# Altium schematic symbol library jlcpcb_2025_04_capacitors_extended_0402.schlib: 3594 symbols (part 18 of 20)
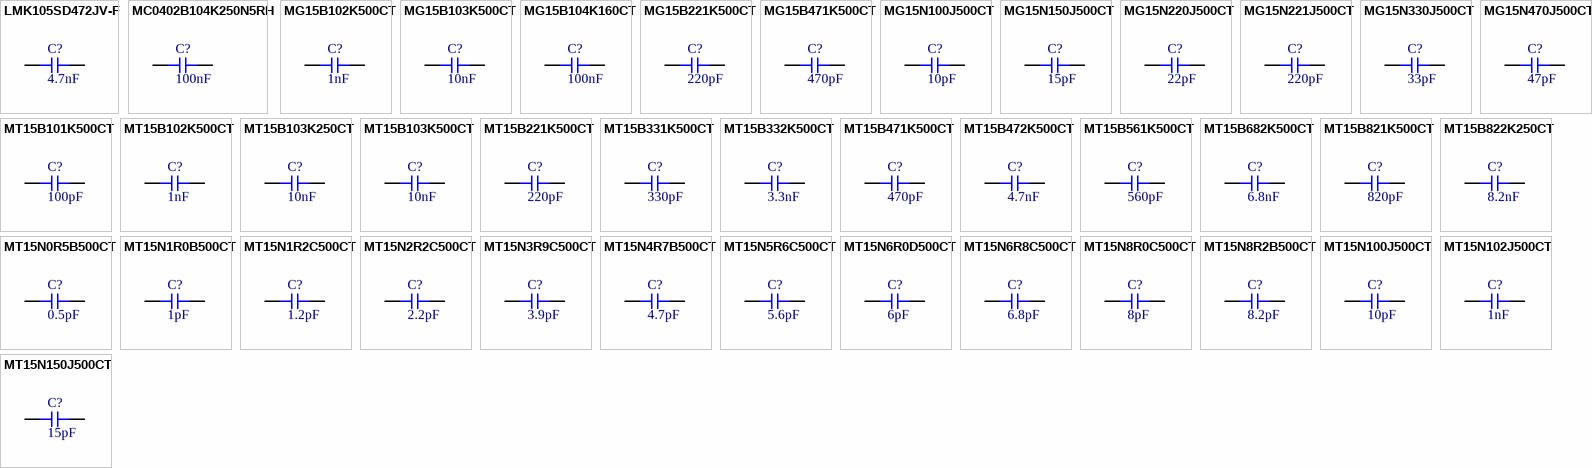
[diagram p106: symbols LMK105SD472JV-F to MT15N150J500CT]

## MT15B822K250CT
designator C?  Capacitance: 8.2nF  (hidden comment: *)
Capacitor, Ceramic (MLCC), 8.2nF, ±10%, 25V, X7R, ±10%, SMD 0402; Manufacturer: Walsin Tech Corp; Manufacturer Part Number: MT15B822K250CT; Package Size: 0402; JLCPCB Basic Part: No; JLCPCB Part Number: C323590; Supplier 1: LCSC; Category: Capacitors - MLCC; Supplier Part Number 1: C323590; Tolerance: ±10%; Voltage Rating: 25V; Temperature Coefficient: X7R; RoHS: Yes; ComponentLink1Description: Datasheet; ComponentLink1URL: https://wmsc.lcsc.com/wmsc/upload/file/pdf/v2/lcsc/2304140030_Walsin-Tech-Corp-MT15B822K250CT_C323590.pdf; ComponentLink2Description: JLCPCB Part URL; ComponentLink2URL: https://jlcpcb.com/partdetail/C323590; ComponentLink3Description: LCSC Part URL; ComponentLink3URL: https://lcsc.com/product-detail/Multilayer-Ceramic-Capacitors-MLCC---SMD-SMT_Walsin-Tech-Corp-Walsin-Tech-Corp-MT15B822K250CT_C323590.html
footprint CAP-0402 (0402 (1005M) Capacitor)
pins: 1, 2

## MT15N0R5B500CT
designator C?  Capacitance: 0.5pF  (hidden comment: *)
Capacitor, Ceramic (MLCC), 0.5pF, 50V, NP0, SMD 0402; Manufacturer: Walsin Tech Corp; Manufacturer Part Number: MT15N0R5B500CT; Package Size: 0402; JLCPCB Basic Part: No; JLCPCB Part Number: C5139576; Supplier 1: LCSC; Category: Capacitors - MLCC; Supplier Part Number 1: C5139576; Voltage Rating: 50V; Temperature Coefficient: NP0; RoHS: Yes; ComponentLink1Description: Datasheet; ComponentLink1URL: https://wmsc.lcsc.com/wmsc/upload/file/pdf/v2/lcsc/2208260930_Walsin-Tech-Corp-MT15N0R5B500CT_C5139576.pdf; ComponentLink2Description: JLCPCB Part URL; ComponentLink2URL: https://jlcpcb.com/partdetail/C5139576; ComponentLink3Description: LCSC Part URL; ComponentLink3URL: https://lcsc.com/product-detail/Multilayer-Ceramic-Capacitors-MLCC---SMD-SMT_Walsin-Tech-Corp-Walsin-Tech-Corp-MT15N0R5B500CT_C5139576.html
footprint CAP-0402 (0402 (1005M) Capacitor)
pins: 1, 2

## MT15N1R0B500CT
designator C?  Capacitance: 1pF  (hidden comment: *)
Capacitor, Ceramic (MLCC), 1pF, 50V, NP0, SMD 0402; Manufacturer: Walsin Tech Corp; Manufacturer Part Number: MT15N1R0B500CT; Package Size: 0402; JLCPCB Basic Part: No; JLCPCB Part Number: C323585; Supplier 1: LCSC; Category: Capacitors - MLCC; Supplier Part Number 1: C323585; Voltage Rating: 50V; Temperature Coefficient: NP0; RoHS: Yes; ComponentLink1Description: Datasheet; ComponentLink1URL: https://wmsc.lcsc.com/wmsc/upload/file/pdf/v2/lcsc/2304140030_Walsin-Tech-Corp-MT15N1R0B500CT_C323585.pdf; ComponentLink2Description: JLCPCB Part URL; ComponentLink2URL: https://jlcpcb.com/partdetail/C323585; ComponentLink3Description: LCSC Part URL; ComponentLink3URL: https://lcsc.com/product-detail/Multilayer-Ceramic-Capacitors-MLCC---SMD-SMT_Walsin-Tech-Corp-Walsin-Tech-Corp-MT15N1R0B500CT_C323585.html
footprint CAP-0402 (0402 (1005M) Capacitor)
pins: 1, 2

## MT15N1R2C500CT
designator C?  Capacitance: 1.2pF  (hidden comment: *)
Capacitor, Ceramic (MLCC), 1.2pF, 50V, NP0, SMD 0402; Manufacturer: Walsin Tech Corp; Manufacturer Part Number: MT15N1R2C500CT; Package Size: 0402; JLCPCB Basic Part: No; JLCPCB Part Number: C908524; Supplier 1: LCSC; Category: Capacitors - MLCC; Supplier Part Number 1: C908524; Voltage Rating: 50V; Temperature Coefficient: NP0; RoHS: Yes; ComponentLink1Description: Datasheet; ComponentLink1URL: https://wmsc.lcsc.com/wmsc/upload/file/pdf/v2/lcsc/2304140030_Walsin-Tech-Corp-MT15N1R2C500CT_C908524.pdf; ComponentLink2Description: JLCPCB Part URL; ComponentLink2URL: https://jlcpcb.com/partdetail/C908524; ComponentLink3Description: LCSC Part URL; ComponentLink3URL: https://lcsc.com/product-detail/Multilayer-Ceramic-Capacitors-MLCC---SMD-SMT_Walsin-Tech-Corp-Walsin-Tech-Corp-MT15N1R2C500CT_C908524.html
footprint CAP-0402 (0402 (1005M) Capacitor)
pins: 1, 2

## MT15N2R2C500CT
designator C?  Capacitance: 2.2pF  (hidden comment: *)
Capacitor, Ceramic (MLCC), 2.2pF, 50V, NP0, SMD 0402; Manufacturer: Walsin Tech Corp; Manufacturer Part Number: MT15N2R2C500CT; Package Size: 0402; JLCPCB Basic Part: No; JLCPCB Part Number: C335537; Supplier 1: LCSC; Category: Capacitors - MLCC; Supplier Part Number 1: C335537; Voltage Rating: 50V; Temperature Coefficient: NP0; RoHS: Yes; ComponentLink1Description: Datasheet; ComponentLink1URL: https://wmsc.lcsc.com/wmsc/upload/file/pdf/v2/lcsc/2304140030_Walsin-Tech-Corp-MT15N2R2C500CT_C335537.pdf; ComponentLink2Description: JLCPCB Part URL; ComponentLink2URL: https://jlcpcb.com/partdetail/C335537; ComponentLink3Description: LCSC Part URL; ComponentLink3URL: https://lcsc.com/product-detail/Multilayer-Ceramic-Capacitors-MLCC---SMD-SMT_Walsin-Tech-Corp-Walsin-Tech-Corp-MT15N2R2C500CT_C335537.html
footprint CAP-0402 (0402 (1005M) Capacitor)
pins: 1, 2

## MT15N3R9C500CT
designator C?  Capacitance: 3.9pF  (hidden comment: *)
Capacitor, Ceramic (MLCC), 3.9pF, 50V, NP0, SMD 0402; Manufacturer: Walsin Tech Corp; Manufacturer Part Number: MT15N3R9C500CT; Package Size: 0402; JLCPCB Basic Part: No; JLCPCB Part Number: C323581; Supplier 1: LCSC; Category: Capacitors - MLCC; Supplier Part Number 1: C323581; Voltage Rating: 50V; Temperature Coefficient: NP0; RoHS: Yes; ComponentLink1Description: Datasheet; ComponentLink1URL: https://wmsc.lcsc.com/wmsc/upload/file/pdf/v2/lcsc/2304140030_Walsin-Tech-Corp-MT15N3R9C500CT_C323581.pdf; ComponentLink2Description: JLCPCB Part URL; ComponentLink2URL: https://jlcpcb.com/partdetail/C323581; ComponentLink3Description: LCSC Part URL; ComponentLink3URL: https://lcsc.com/product-detail/Multilayer-Ceramic-Capacitors-MLCC---SMD-SMT_Walsin-Tech-Corp-Walsin-Tech-Corp-MT15N3R9C500CT_C323581.html
footprint CAP-0402 (0402 (1005M) Capacitor)
pins: 1, 2

## MT15N4R7B500CT
designator C?  Capacitance: 4.7pF  (hidden comment: *)
Capacitor, Ceramic (MLCC), 4.7pF, 50V, NP0, SMD 0402; Manufacturer: Walsin Tech Corp; Manufacturer Part Number: MT15N4R7B500CT; Package Size: 0402; JLCPCB Basic Part: No; JLCPCB Part Number: C2875523; Supplier 1: LCSC; Category: Capacitors - MLCC; Supplier Part Number 1: C2875523; Voltage Rating: 50V; Temperature Coefficient: NP0; RoHS: Yes; ComponentLink1Description: Datasheet; ComponentLink1URL: https://wmsc.lcsc.com/wmsc/upload/file/pdf/v2/lcsc/2108241230_Walsin-Tech-Corp-MT15N4R7B500CT_C2875523.pdf; ComponentLink2Description: JLCPCB Part URL; ComponentLink2URL: https://jlcpcb.com/partdetail/C2875523; ComponentLink3Description: LCSC Part URL; ComponentLink3URL: https://lcsc.com/product-detail/Multilayer-Ceramic-Capacitors-MLCC---SMD-SMT_Walsin-Tech-Corp-Walsin-Tech-Corp-MT15N4R7B500CT_C2875523.html
footprint CAP-0402 (0402 (1005M) Capacitor)
pins: 1, 2

## MT15N5R6C500CT
designator C?  Capacitance: 5.6pF  (hidden comment: *)
Capacitor, Ceramic (MLCC), 5.6pF, 50V, NP0, SMD 0402; Manufacturer: Walsin Tech Corp; Manufacturer Part Number: MT15N5R6C500CT; Package Size: 0402; JLCPCB Basic Part: No; JLCPCB Part Number: C323578; Supplier 1: LCSC; Category: Capacitors - MLCC; Supplier Part Number 1: C323578; Voltage Rating: 50V; Temperature Coefficient: NP0; RoHS: Yes; ComponentLink1Description: Datasheet; ComponentLink1URL: https://wmsc.lcsc.com/wmsc/upload/file/pdf/v2/lcsc/2304140030_Walsin-Tech-Corp-MT15N5R6C500CT_C323578.pdf; ComponentLink2Description: JLCPCB Part URL; ComponentLink2URL: https://jlcpcb.com/partdetail/C323578; ComponentLink3Description: LCSC Part URL; ComponentLink3URL: https://lcsc.com/product-detail/Multilayer-Ceramic-Capacitors-MLCC---SMD-SMT_Walsin-Tech-Corp-Walsin-Tech-Corp-MT15N5R6C500CT_C323578.html
footprint CAP-0402 (0402 (1005M) Capacitor)
pins: 1, 2

## MT15N6R0D500CT
designator C?  Capacitance: 6pF  (hidden comment: *)
Capacitor, Ceramic (MLCC), 6pF, 50V, NP0, SMD 0402; Manufacturer: Walsin Tech Corp; Manufacturer Part Number: MT15N6R0D500CT; Package Size: 0402; JLCPCB Basic Part: No; JLCPCB Part Number: C2918527; Supplier 1: LCSC; Category: Capacitors - MLCC; Supplier Part Number 1: C2918527; Voltage Rating: 50V; Temperature Coefficient: NP0; RoHS: Yes; ComponentLink1Description: Datasheet; ComponentLink1URL: https://wmsc.lcsc.com/wmsc/upload/file/pdf/v2/lcsc/2111171830_Walsin-Tech-Corp-MT15N6R0D500CT_C2918527.pdf; ComponentLink2Description: JLCPCB Part URL; ComponentLink2URL: https://jlcpcb.com/partdetail/C2918527; ComponentLink3Description: LCSC Part URL; ComponentLink3URL: https://lcsc.com/product-detail/Multilayer-Ceramic-Capacitors-MLCC---SMD-SMT_Walsin-Tech-Corp-Walsin-Tech-Corp-MT15N6R0D500CT_C2918527.html
footprint CAP-0402 (0402 (1005M) Capacitor)
pins: 1, 2

## MT15N6R8C500CT
designator C?  Capacitance: 6.8pF  (hidden comment: *)
Capacitor, Ceramic (MLCC), 6.8pF, 50V, NP0, SMD 0402; Manufacturer: Walsin Tech Corp; Manufacturer Part Number: MT15N6R8C500CT; Package Size: 0402; JLCPCB Basic Part: No; JLCPCB Part Number: C323577; Supplier 1: LCSC; Category: Capacitors - MLCC; Supplier Part Number 1: C323577; Voltage Rating: 50V; Temperature Coefficient: NP0; RoHS: Yes; ComponentLink1Description: Datasheet; ComponentLink1URL: https://wmsc.lcsc.com/wmsc/upload/file/pdf/v2/lcsc/2304140030_Walsin-Tech-Corp-MT15N6R8C500CT_C323577.pdf; ComponentLink2Description: JLCPCB Part URL; ComponentLink2URL: https://jlcpcb.com/partdetail/C323577; ComponentLink3Description: LCSC Part URL; ComponentLink3URL: https://lcsc.com/product-detail/Multilayer-Ceramic-Capacitors-MLCC---SMD-SMT_Walsin-Tech-Corp-Walsin-Tech-Corp-MT15N6R8C500CT_C323577.html
footprint CAP-0402 (0402 (1005M) Capacitor)
pins: 1, 2

## MT15N8R0C500CT
designator C?  Capacitance: 8pF  (hidden comment: *)
Capacitor, Ceramic (MLCC), 8pF, 50V, NP0, SMD 0402; Manufacturer: Walsin Tech Corp; Manufacturer Part Number: MT15N8R0C500CT; Package Size: 0402; JLCPCB Basic Part: No; JLCPCB Part Number: C335539; Supplier 1: LCSC; Category: Capacitors - MLCC; Supplier Part Number 1: C335539; Voltage Rating: 50V; Temperature Coefficient: NP0; RoHS: Yes; ComponentLink1Description: Datasheet; ComponentLink1URL: https://wmsc.lcsc.com/wmsc/upload/file/pdf/v2/lcsc/2304140030_Walsin-Tech-Corp-MT15N8R0C500CT_C335539.pdf; ComponentLink2Description: JLCPCB Part URL; ComponentLink2URL: https://jlcpcb.com/partdetail/C335539; ComponentLink3Description: LCSC Part URL; ComponentLink3URL: https://lcsc.com/product-detail/Multilayer-Ceramic-Capacitors-MLCC---SMD-SMT_Walsin-Tech-Corp-Walsin-Tech-Corp-MT15N8R0C500CT_C335539.html
footprint CAP-0402 (0402 (1005M) Capacitor)
pins: 1, 2

## MT15N8R2B500CT
designator C?  Capacitance: 8.2pF  (hidden comment: *)
Capacitor, Ceramic (MLCC), 8.2pF, 50V, NP0, SMD 0402; Manufacturer: Walsin Tech Corp; Manufacturer Part Number: MT15N8R2B500CT; Package Size: 0402; JLCPCB Basic Part: No; JLCPCB Part Number: C323575; Supplier 1: LCSC; Category: Capacitors - MLCC; Supplier Part Number 1: C323575; Voltage Rating: 50V; Temperature Coefficient: NP0; RoHS: Yes; ComponentLink1Description: Datasheet; ComponentLink1URL: https://wmsc.lcsc.com/wmsc/upload/file/pdf/v2/lcsc/2304140030_Walsin-Tech-Corp-MT15N8R2B500CT_C323575.pdf; ComponentLink2Description: JLCPCB Part URL; ComponentLink2URL: https://jlcpcb.com/partdetail/C323575; ComponentLink3Description: LCSC Part URL; ComponentLink3URL: https://lcsc.com/product-detail/Multilayer-Ceramic-Capacitors-MLCC---SMD-SMT_Walsin-Tech-Corp-Walsin-Tech-Corp-MT15N8R2B500CT_C323575.html
footprint CAP-0402 (0402 (1005M) Capacitor)
pins: 1, 2

## MT15N100J500CT
designator C?  Capacitance: 10pF  (hidden comment: *)
Capacitor, Ceramic (MLCC), 10pF, ±5%, 50V, NP0, ±5%, SMD 0402; Manufacturer: Walsin Tech Corp; Manufacturer Part Number: MT15N100J500CT; Package Size: 0402; JLCPCB Basic Part: No; JLCPCB Part Number: C323589; Supplier 1: LCSC; Category: Capacitors - MLCC; Supplier Part Number 1: C323589; Tolerance: ±5%; Voltage Rating: 50V; Temperature Coefficient: NP0; RoHS: Yes; ComponentLink1Description: Datasheet; ComponentLink1URL: https://wmsc.lcsc.com/wmsc/upload/file/pdf/v2/lcsc/2304140030_Walsin-Tech-Corp-MT15N100J500CT_C323589.pdf; ComponentLink2Description: JLCPCB Part URL; ComponentLink2URL: https://jlcpcb.com/partdetail/C323589; ComponentLink3Description: LCSC Part URL; ComponentLink3URL: https://lcsc.com/product-detail/Multilayer-Ceramic-Capacitors-MLCC---SMD-SMT_Walsin-Tech-Corp-Walsin-Tech-Corp-MT15N100J500CT_C323589.html
footprint CAP-0402 (0402 (1005M) Capacitor)
pins: 1, 2

## MT15N102J500CT
designator C?  Capacitance: 1nF  (hidden comment: *)
Capacitor, Ceramic (MLCC), 1nF, ±5%, 50V, NP0, ±5%, SMD 0402; Manufacturer: Walsin Tech Corp; Manufacturer Part Number: MT15N102J500CT; Package Size: 0402; JLCPCB Basic Part: No; JLCPCB Part Number: C908533; Supplier 1: LCSC; Category: Capacitors - MLCC; Supplier Part Number 1: C908533; Tolerance: ±5%; Voltage Rating: 50V; Temperature Coefficient: NP0; RoHS: Yes; ComponentLink1Description: Datasheet; ComponentLink1URL: https://wmsc.lcsc.com/wmsc/upload/file/pdf/v2/lcsc/2304140030_Walsin-Tech-Corp-MT15N102J500CT_C908533.pdf; ComponentLink2Description: JLCPCB Part URL; ComponentLink2URL: https://jlcpcb.com/partdetail/C908533; ComponentLink3Description: LCSC Part URL; ComponentLink3URL: https://lcsc.com/product-detail/Multilayer-Ceramic-Capacitors-MLCC---SMD-SMT_Walsin-Tech-Corp-Walsin-Tech-Corp-MT15N102J500CT_C908533.html
footprint CAP-0402 (0402 (1005M) Capacitor)
pins: 1, 2

## MT15N150J500CT
designator C?  Capacitance: 15pF  (hidden comment: *)
Capacitor, Ceramic (MLCC), 15pF, ±5%, 50V, NP0, ±5%, SMD 0402; Manufacturer: Walsin Tech Corp; Manufacturer Part Number: MT15N150J500CT; Package Size: 0402; JLCPCB Basic Part: No; JLCPCB Part Number: C323586; Supplier 1: LCSC; Category: Capacitors - MLCC; Supplier Part Number 1: C323586; Tolerance: ±5%; Voltage Rating: 50V; Temperature Coefficient: NP0; RoHS: Yes; ComponentLink1Description: Datasheet; ComponentLink1URL: https://wmsc.lcsc.com/wmsc/upload/file/pdf/v2/lcsc/2304140030_Walsin-Tech-Corp-MT15N150J500CT_C323586.pdf; ComponentLink2Description: JLCPCB Part URL; ComponentLink2URL: https://jlcpcb.com/partdetail/C323586; ComponentLink3Description: LCSC Part URL; ComponentLink3URL: https://lcsc.com/product-detail/Multilayer-Ceramic-Capacitors-MLCC---SMD-SMT_Walsin-Tech-Corp-Walsin-Tech-Corp-MT15N150J500CT_C323586.html
footprint CAP-0402 (0402 (1005M) Capacitor)
pins: 1, 2

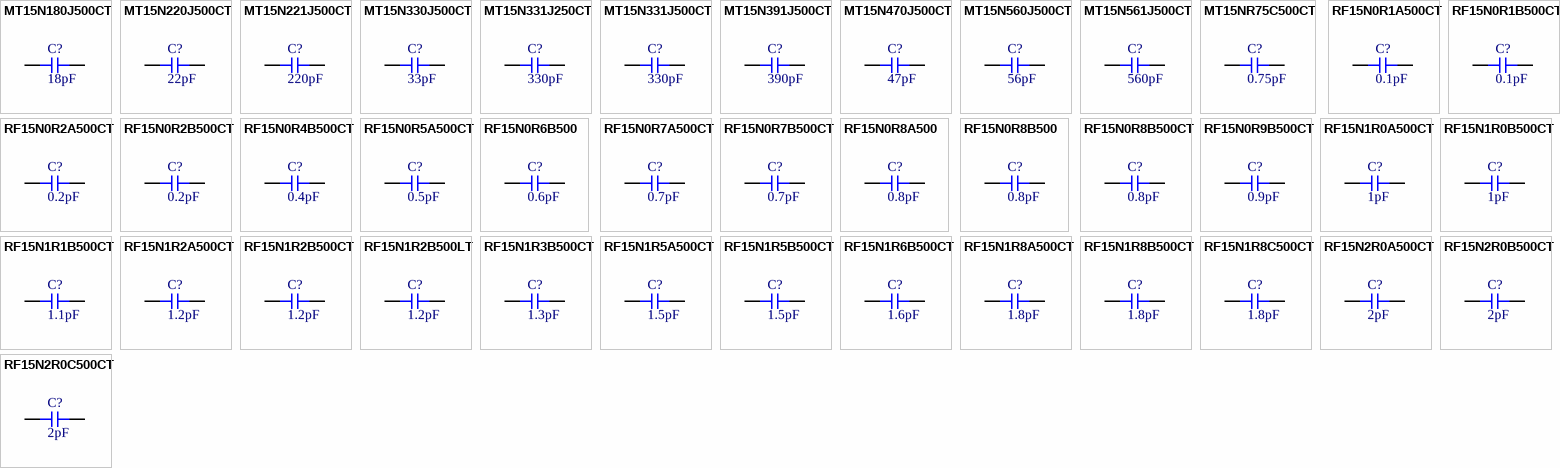
[diagram p79: symbols MT15N180J500CT to RF15N2R0C500CT]

## MT15N180J500CT
designator C?  Capacitance: 18pF  (hidden comment: *)
Capacitor, Ceramic (MLCC), 18pF, ±5%, 50V, NP0, ±5%, SMD 0402; Manufacturer: Walsin Tech Corp; Manufacturer Part Number: MT15N180J500CT; Package Size: 0402; JLCPCB Basic Part: No; JLCPCB Part Number: C908534; Supplier 1: LCSC; Category: Capacitors - MLCC; Supplier Part Number 1: C908534; Tolerance: ±5%; Voltage Rating: 50V; Temperature Coefficient: NP0; RoHS: Yes; ComponentLink1Description: Datasheet; ComponentLink1URL: https://wmsc.lcsc.com/wmsc/upload/file/pdf/v2/lcsc/2304140030_Walsin-Tech-Corp-MT15N180J500CT_C908534.pdf; ComponentLink2Description: JLCPCB Part URL; ComponentLink2URL: https://jlcpcb.com/partdetail/C908534; ComponentLink3Description: LCSC Part URL; ComponentLink3URL: https://lcsc.com/product-detail/Multilayer-Ceramic-Capacitors-MLCC---SMD-SMT_Walsin-Tech-Corp-Walsin-Tech-Corp-MT15N180J500CT_C908534.html
footprint CAP-0402 (0402 (1005M) Capacitor)
pins: 1, 2

## MT15N220J500CT
designator C?  Capacitance: 22pF  (hidden comment: *)
Capacitor, Ceramic (MLCC), 22pF, ±5%, 50V, NP0, ±5%, SMD 0402; Manufacturer: Walsin Tech Corp; Manufacturer Part Number: MT15N220J500CT; Package Size: 0402; JLCPCB Basic Part: No; JLCPCB Part Number: C908546; Supplier 1: LCSC; Category: Capacitors - MLCC; Supplier Part Number 1: C908546; Tolerance: ±5%; Voltage Rating: 50V; Temperature Coefficient: NP0; RoHS: Yes; ComponentLink1Description: Datasheet; ComponentLink1URL: https://wmsc.lcsc.com/wmsc/upload/file/pdf/v2/lcsc/2304140030_Walsin-Tech-Corp-MT15N220J500CT_C908546.pdf; ComponentLink2Description: JLCPCB Part URL; ComponentLink2URL: https://jlcpcb.com/partdetail/C908546; ComponentLink3Description: LCSC Part URL; ComponentLink3URL: https://lcsc.com/product-detail/Multilayer-Ceramic-Capacitors-MLCC---SMD-SMT_Walsin-Tech-Corp-Walsin-Tech-Corp-MT15N220J500CT_C908546.html
footprint CAP-0402 (0402 (1005M) Capacitor)
pins: 1, 2

## MT15N221J500CT
designator C?  Capacitance: 220pF  (hidden comment: *)
Capacitor, Ceramic (MLCC), 220pF, ±5%, 50V, NP0, ±5%, SMD 0402; Manufacturer: Walsin Tech Corp; Manufacturer Part Number: MT15N221J500CT; Package Size: 0402; JLCPCB Basic Part: No; JLCPCB Part Number: C908535; Supplier 1: LCSC; Category: Capacitors - MLCC; Supplier Part Number 1: C908535; Tolerance: ±5%; Voltage Rating: 50V; Temperature Coefficient: NP0; RoHS: Yes; ComponentLink1Description: Datasheet; ComponentLink1URL: https://wmsc.lcsc.com/wmsc/upload/file/pdf/v2/lcsc/2304140030_Walsin-Tech-Corp-MT15N221J500CT_C908535.pdf; ComponentLink2Description: JLCPCB Part URL; ComponentLink2URL: https://jlcpcb.com/partdetail/C908535; ComponentLink3Description: LCSC Part URL; ComponentLink3URL: https://lcsc.com/product-detail/Multilayer-Ceramic-Capacitors-MLCC---SMD-SMT_Walsin-Tech-Corp-Walsin-Tech-Corp-MT15N221J500CT_C908535.html
footprint CAP-0402 (0402 (1005M) Capacitor)
pins: 1, 2

## MT15N330J500CT
designator C?  Capacitance: 33pF  (hidden comment: *)
Capacitor, Ceramic (MLCC), 33pF, ±5%, 50V, NP0, ±5%, SMD 0402; Manufacturer: Walsin Tech Corp; Manufacturer Part Number: MT15N330J500CT; Package Size: 0402; JLCPCB Basic Part: No; JLCPCB Part Number: C323583; Supplier 1: LCSC; Category: Capacitors - MLCC; Supplier Part Number 1: C323583; Tolerance: ±5%; Voltage Rating: 50V; Temperature Coefficient: NP0; RoHS: Yes; ComponentLink1Description: Datasheet; ComponentLink1URL: https://wmsc.lcsc.com/wmsc/upload/file/pdf/v2/lcsc/2304140030_Walsin-Tech-Corp-MT15N330J500CT_C323583.pdf; ComponentLink2Description: JLCPCB Part URL; ComponentLink2URL: https://jlcpcb.com/partdetail/C323583; ComponentLink3Description: LCSC Part URL; ComponentLink3URL: https://lcsc.com/product-detail/Multilayer-Ceramic-Capacitors-MLCC---SMD-SMT_Walsin-Tech-Corp-Walsin-Tech-Corp-MT15N330J500CT_C323583.html
footprint CAP-0402 (0402 (1005M) Capacitor)
pins: 1, 2

## MT15N331J250CT
designator C?  Capacitance: 330pF  (hidden comment: *)
Capacitor, Ceramic (MLCC), 330pF, ±5%, 25V, NP0, ±5%, SMD 0402; Manufacturer: Walsin Tech Corp; Manufacturer Part Number: MT15N331J250CT; Package Size: 0402; JLCPCB Basic Part: No; JLCPCB Part Number: C458955; Supplier 1: LCSC; Category: Capacitors - MLCC; Supplier Part Number 1: C458955; Tolerance: ±5%; Voltage Rating: 25V; Temperature Coefficient: NP0; RoHS: Yes; ComponentLink1Description: Datasheet; ComponentLink1URL: https://wmsc.lcsc.com/wmsc/upload/file/pdf/v2/lcsc/2304140030_Walsin-Tech-Corp-MT15N331J250CT_C458955.pdf; ComponentLink2Description: JLCPCB Part URL; ComponentLink2URL: https://jlcpcb.com/partdetail/C458955; ComponentLink3Description: LCSC Part URL; ComponentLink3URL: https://lcsc.com/product-detail/Multilayer-Ceramic-Capacitors-MLCC---SMD-SMT_Walsin-Tech-Corp-Walsin-Tech-Corp-MT15N331J250CT_C458955.html
footprint CAP-0402 (0402 (1005M) Capacitor)
pins: 1, 2

## MT15N331J500CT
designator C?  Capacitance: 330pF  (hidden comment: *)
Capacitor, Ceramic (MLCC), 330pF, ±5%, 50V, NP0, ±5%, SMD 0402; Manufacturer: Walsin Tech Corp; Manufacturer Part Number: MT15N331J500CT; Package Size: 0402; JLCPCB Basic Part: No; JLCPCB Part Number: C908536; Supplier 1: LCSC; Category: Capacitors - MLCC; Supplier Part Number 1: C908536; Tolerance: ±5%; Voltage Rating: 50V; Temperature Coefficient: NP0; RoHS: Yes; ComponentLink1Description: Datasheet; ComponentLink1URL: https://wmsc.lcsc.com/wmsc/upload/file/pdf/v2/lcsc/2304140030_Walsin-Tech-Corp-MT15N331J500CT_C908536.pdf; ComponentLink2Description: JLCPCB Part URL; ComponentLink2URL: https://jlcpcb.com/partdetail/C908536; ComponentLink3Description: LCSC Part URL; ComponentLink3URL: https://lcsc.com/product-detail/Multilayer-Ceramic-Capacitors-MLCC---SMD-SMT_Walsin-Tech-Corp-Walsin-Tech-Corp-MT15N331J500CT_C908536.html
footprint CAP-0402 (0402 (1005M) Capacitor)
pins: 1, 2

## MT15N391J500CT
designator C?  Capacitance: 390pF  (hidden comment: *)
Capacitor, Ceramic (MLCC), 390pF, ±5%, 50V, NP0, ±5%, SMD 0402; Manufacturer: Walsin Tech Corp; Manufacturer Part Number: MT15N391J500CT; Package Size: 0402; JLCPCB Basic Part: No; JLCPCB Part Number: C908537; Supplier 1: LCSC; Category: Capacitors - MLCC; Supplier Part Number 1: C908537; Tolerance: ±5%; Voltage Rating: 50V; Temperature Coefficient: NP0; RoHS: Yes; ComponentLink1Description: Datasheet; ComponentLink1URL: https://wmsc.lcsc.com/wmsc/upload/file/pdf/v2/lcsc/2304140030_Walsin-Tech-Corp-MT15N391J500CT_C908537.pdf; ComponentLink2Description: JLCPCB Part URL; ComponentLink2URL: https://jlcpcb.com/partdetail/C908537; ComponentLink3Description: LCSC Part URL; ComponentLink3URL: https://lcsc.com/product-detail/Multilayer-Ceramic-Capacitors-MLCC---SMD-SMT_Walsin-Tech-Corp-Walsin-Tech-Corp-MT15N391J500CT_C908537.html
footprint CAP-0402 (0402 (1005M) Capacitor)
pins: 1, 2

## MT15N470J500CT
designator C?  Capacitance: 47pF  (hidden comment: *)
Capacitor, Ceramic (MLCC), 47pF, ±5%, 50V, NP0, ±5%, SMD 0402; Manufacturer: Walsin Tech Corp; Manufacturer Part Number: MT15N470J500CT; Package Size: 0402; JLCPCB Basic Part: No; JLCPCB Part Number: C2918525; Supplier 1: LCSC; Category: Capacitors - MLCC; Supplier Part Number 1: C2918525; Tolerance: ±5%; Voltage Rating: 50V; Temperature Coefficient: NP0; RoHS: Yes; ComponentLink1Description: Datasheet; ComponentLink1URL: https://wmsc.lcsc.com/wmsc/upload/file/pdf/v2/lcsc/2111171830_Walsin-Tech-Corp-MT15N470J500CT_C2918525.pdf; ComponentLink2Description: JLCPCB Part URL; ComponentLink2URL: https://jlcpcb.com/partdetail/C2918525; ComponentLink3Description: LCSC Part URL; ComponentLink3URL: https://lcsc.com/product-detail/Multilayer-Ceramic-Capacitors-MLCC---SMD-SMT_Walsin-Tech-Corp-Walsin-Tech-Corp-MT15N470J500CT_C2918525.html
footprint CAP-0402 (0402 (1005M) Capacitor)
pins: 1, 2

## MT15N560J500CT
designator C?  Capacitance: 56pF  (hidden comment: *)
Capacitor, Ceramic (MLCC), 56pF, ±5%, 50V, NP0, ±5%, SMD 0402; Manufacturer: Walsin Tech Corp; Manufacturer Part Number: MT15N560J500CT; Package Size: 0402; JLCPCB Basic Part: No; JLCPCB Part Number: C335543; Supplier 1: LCSC; Category: Capacitors - MLCC; Supplier Part Number 1: C335543; Tolerance: ±5%; Voltage Rating: 50V; Temperature Coefficient: NP0; RoHS: Yes; ComponentLink1Description: Datasheet; ComponentLink1URL: https://wmsc.lcsc.com/wmsc/upload/file/pdf/v2/lcsc/2304140030_Walsin-Tech-Corp-MT15N560J500CT_C335543.pdf; ComponentLink2Description: JLCPCB Part URL; ComponentLink2URL: https://jlcpcb.com/partdetail/C335543; ComponentLink3Description: LCSC Part URL; ComponentLink3URL: https://lcsc.com/product-detail/Multilayer-Ceramic-Capacitors-MLCC---SMD-SMT_Walsin-Tech-Corp-Walsin-Tech-Corp-MT15N560J500CT_C335543.html
footprint CAP-0402 (0402 (1005M) Capacitor)
pins: 1, 2

## MT15N561J500CT
designator C?  Capacitance: 560pF  (hidden comment: *)
Capacitor, Ceramic (MLCC), 560pF, ±5%, 50V, NP0, ±5%, SMD 0402; Manufacturer: Walsin Tech Corp; Manufacturer Part Number: MT15N561J500CT; Package Size: 0402; JLCPCB Basic Part: No; JLCPCB Part Number: C908538; Supplier 1: LCSC; Category: Capacitors - MLCC; Supplier Part Number 1: C908538; Tolerance: ±5%; Voltage Rating: 50V; Temperature Coefficient: NP0; RoHS: Yes; ComponentLink1Description: Datasheet; ComponentLink1URL: https://wmsc.lcsc.com/wmsc/upload/file/pdf/v2/lcsc/2304140030_Walsin-Tech-Corp-MT15N561J500CT_C908538.pdf; ComponentLink2Description: JLCPCB Part URL; ComponentLink2URL: https://jlcpcb.com/partdetail/C908538; ComponentLink3Description: LCSC Part URL; ComponentLink3URL: https://lcsc.com/product-detail/Multilayer-Ceramic-Capacitors-MLCC---SMD-SMT_Walsin-Tech-Corp-Walsin-Tech-Corp-MT15N561J500CT_C908538.html
footprint CAP-0402 (0402 (1005M) Capacitor)
pins: 1, 2

## MT15NR75C500CT
designator C?  Capacitance: 0.75pF  (hidden comment: *)
Capacitor, Ceramic (MLCC), 0.75pF, 50V, NP0, SMD 0402; Manufacturer: Walsin Tech Corp; Manufacturer Part Number: MT15NR75C500CT; Package Size: 0402; JLCPCB Basic Part: No; JLCPCB Part Number: C908527; Supplier 1: LCSC; Category: Capacitors - MLCC; Supplier Part Number 1: C908527; Voltage Rating: 50V; Temperature Coefficient: NP0; RoHS: Yes; ComponentLink1Description: Datasheet; ComponentLink1URL: https://wmsc.lcsc.com/wmsc/upload/file/pdf/v2/lcsc/2304140030_Walsin-Tech-Corp-MT15NR75C500CT_C908527.pdf; ComponentLink2Description: JLCPCB Part URL; ComponentLink2URL: https://jlcpcb.com/partdetail/C908527; ComponentLink3Description: LCSC Part URL; ComponentLink3URL: https://lcsc.com/product-detail/Multilayer-Ceramic-Capacitors-MLCC---SMD-SMT_Walsin-Tech-Corp-Walsin-Tech-Corp-MT15NR75C500CT_C908527.html
footprint CAP-0402 (0402 (1005M) Capacitor)
pins: 1, 2

## RF15N0R1A500CT
designator C?  Capacitance: 0.1pF  (hidden comment: *)
Capacitor, Ceramic (MLCC), 0.1pF, 50V, NP0, SMD 0402; Manufacturer: Walsin Tech Corp; Manufacturer Part Number: RF15N0R1A500CT; Package Size: 0402; JLCPCB Basic Part: No; JLCPCB Part Number: C396867; Supplier 1: LCSC; Category: Capacitors - MLCC; Supplier Part Number 1: C396867; Voltage Rating: 50V; Temperature Coefficient: NP0; RoHS: Yes; ComponentLink1Description: Datasheet; ComponentLink1URL: https://wmsc.lcsc.com/wmsc/upload/file/pdf/v2/lcsc/2304140030_Walsin-Tech-Corp-RF15N0R1A500CT_C396867.pdf; ComponentLink2Description: JLCPCB Part URL; ComponentLink2URL: https://jlcpcb.com/partdetail/C396867; ComponentLink3Description: LCSC Part URL; ComponentLink3URL: https://lcsc.com/product-detail/Multilayer-Ceramic-Capacitors-MLCC---SMD-SMT_Walsin-Tech-Corp-Walsin-Tech-Corp-RF15N0R1A500CT_C396867.html
footprint CAP-0402 (0402 (1005M) Capacitor)
pins: 1, 2

## RF15N0R1B500CT
designator C?  Capacitance: 0.1pF  (hidden comment: *)
Capacitor, Ceramic (MLCC), 0.1pF, 50V, NP0, SMD 0402; Manufacturer: Walsin Tech Corp; Manufacturer Part Number: RF15N0R1B500CT; Package Size: 0402; JLCPCB Basic Part: No; JLCPCB Part Number: C384683; Supplier 1: LCSC; Category: Capacitors - MLCC; Supplier Part Number 1: C384683; Voltage Rating: 50V; Temperature Coefficient: NP0; RoHS: Yes; ComponentLink1Description: Datasheet; ComponentLink1URL: https://wmsc.lcsc.com/wmsc/upload/file/pdf/v2/lcsc/2304140030_Walsin-Tech-Corp-RF15N0R1B500CT_C384683.pdf; ComponentLink2Description: JLCPCB Part URL; ComponentLink2URL: https://jlcpcb.com/partdetail/C384683; ComponentLink3Description: LCSC Part URL; ComponentLink3URL: https://lcsc.com/product-detail/Multilayer-Ceramic-Capacitors-MLCC---SMD-SMT_Walsin-Tech-Corp-Walsin-Tech-Corp-RF15N0R1B500CT_C384683.html
footprint CAP-0402 (0402 (1005M) Capacitor)
pins: 1, 2

## RF15N0R2A500CT
designator C?  Capacitance: 0.2pF  (hidden comment: *)
Capacitor, Ceramic (MLCC), 0.2pF, 50V, NP0, SMD 0402; Manufacturer: Walsin Tech Corp; Manufacturer Part Number: RF15N0R2A500CT; Package Size: 0402; JLCPCB Basic Part: No; JLCPCB Part Number: C396868; Supplier 1: LCSC; Category: Capacitors - MLCC; Supplier Part Number 1: C396868; Voltage Rating: 50V; Temperature Coefficient: NP0; RoHS: Yes; ComponentLink1Description: Datasheet; ComponentLink1URL: https://wmsc.lcsc.com/wmsc/upload/file/pdf/v2/lcsc/2304140030_Walsin-Tech-Corp-RF15N0R2A500CT_C396868.pdf; ComponentLink2Description: JLCPCB Part URL; ComponentLink2URL: https://jlcpcb.com/partdetail/C396868; ComponentLink3Description: LCSC Part URL; ComponentLink3URL: https://lcsc.com/product-detail/Multilayer-Ceramic-Capacitors-MLCC---SMD-SMT_Walsin-Tech-Corp-Walsin-Tech-Corp-RF15N0R2A500CT_C396868.html
footprint CAP-0402 (0402 (1005M) Capacitor)
pins: 1, 2

## RF15N0R2B500CT
designator C?  Capacitance: 0.2pF  (hidden comment: *)
Capacitor, Ceramic (MLCC), 0.2pF, 50V, NP0, SMD 0402; Manufacturer: Walsin Tech Corp; Manufacturer Part Number: RF15N0R2B500CT; Package Size: 0402; JLCPCB Basic Part: No; JLCPCB Part Number: C396869; Supplier 1: LCSC; Category: Capacitors - MLCC; Supplier Part Number 1: C396869; Voltage Rating: 50V; Temperature Coefficient: NP0; RoHS: Yes; ComponentLink1Description: Datasheet; ComponentLink1URL: https://wmsc.lcsc.com/wmsc/upload/file/pdf/v2/lcsc/2304140030_Walsin-Tech-Corp-RF15N0R2B500CT_C396869.pdf; ComponentLink2Description: JLCPCB Part URL; ComponentLink2URL: https://jlcpcb.com/partdetail/C396869; ComponentLink3Description: LCSC Part URL; ComponentLink3URL: https://lcsc.com/product-detail/Multilayer-Ceramic-Capacitors-MLCC---SMD-SMT_Walsin-Tech-Corp-Walsin-Tech-Corp-RF15N0R2B500CT_C396869.html
footprint CAP-0402 (0402 (1005M) Capacitor)
pins: 1, 2

## RF15N0R4B500CT
designator C?  Capacitance: 0.4pF  (hidden comment: *)
Capacitor, Ceramic (MLCC), 0.4pF, 50V, NP0, SMD 0402; Manufacturer: Walsin Tech Corp; Manufacturer Part Number: RF15N0R4B500CT; Package Size: 0402; JLCPCB Basic Part: No; JLCPCB Part Number: C384682; Supplier 1: LCSC; Category: Capacitors - MLCC; Supplier Part Number 1: C384682; Voltage Rating: 50V; Temperature Coefficient: NP0; RoHS: Yes; ComponentLink1Description: Datasheet; ComponentLink1URL: https://wmsc.lcsc.com/wmsc/upload/file/pdf/v2/lcsc/2304140030_Walsin-Tech-Corp-RF15N0R4B500CT_C384682.pdf; ComponentLink2Description: JLCPCB Part URL; ComponentLink2URL: https://jlcpcb.com/partdetail/C384682; ComponentLink3Description: LCSC Part URL; ComponentLink3URL: https://lcsc.com/product-detail/Multilayer-Ceramic-Capacitors-MLCC---SMD-SMT_Walsin-Tech-Corp-Walsin-Tech-Corp-RF15N0R4B500CT_C384682.html
footprint CAP-0402 (0402 (1005M) Capacitor)
pins: 1, 2

## RF15N0R5A500CT
designator C?  Capacitance: 0.5pF  (hidden comment: *)
Capacitor, Ceramic (MLCC), 0.5pF, 50V, NP0, SMD 0402; Manufacturer: Walsin Tech Corp; Manufacturer Part Number: RF15N0R5A500CT; Package Size: 0402; JLCPCB Basic Part: No; JLCPCB Part Number: C172855; Supplier 1: LCSC; Category: Capacitors - MLCC; Supplier Part Number 1: C172855; Voltage Rating: 50V; Temperature Coefficient: NP0; RoHS: Yes; ComponentLink1Description: Datasheet; ComponentLink1URL: https://wmsc.lcsc.com/wmsc/upload/file/pdf/v2/lcsc/2304140030_Walsin-Tech-Corp-RF15N0R5A500CT_C172855.pdf; ComponentLink2Description: JLCPCB Part URL; ComponentLink2URL: https://jlcpcb.com/partdetail/C172855; ComponentLink3Description: LCSC Part URL; ComponentLink3URL: https://lcsc.com/product-detail/Multilayer-Ceramic-Capacitors-MLCC---SMD-SMT_Walsin-Tech-Corp-Walsin-Tech-Corp-RF15N0R5A500CT_C172855.html
footprint CAP-0402 (0402 (1005M) Capacitor)
pins: 1, 2

## RF15N0R6B500
designator C?  Capacitance: 0.6pF  (hidden comment: *)
Capacitor, Ceramic (MLCC), 0.6pF, 50V, NP0, SMD 0402; Manufacturer: Walsin Tech Corp; Manufacturer Part Number: RF15N0R6B500; Package Size: 0402; JLCPCB Basic Part: No; JLCPCB Part Number: C172844; Supplier 1: LCSC; Category: Capacitors - MLCC; Supplier Part Number 1: C172844; Voltage Rating: 50V; Temperature Coefficient: NP0; RoHS: Yes; ComponentLink1Description: Datasheet; ComponentLink1URL: https://wmsc.lcsc.com/wmsc/upload/file/pdf/v2/lcsc/2304140030_Walsin-Tech-Corp-RF15N0R6B500_C172844.pdf; ComponentLink2Description: JLCPCB Part URL; ComponentLink2URL: https://jlcpcb.com/partdetail/C172844; ComponentLink3Description: LCSC Part URL; ComponentLink3URL: https://lcsc.com/product-detail/Multilayer-Ceramic-Capacitors-MLCC---SMD-SMT_Walsin-Tech-Corp-Walsin-Tech-Corp-RF15N0R6B500_C172844.html
footprint CAP-0402 (0402 (1005M) Capacitor)
pins: 1, 2

## RF15N0R7A500CT
designator C?  Capacitance: 0.7pF  (hidden comment: *)
Capacitor, Ceramic (MLCC), 0.7pF, 50V, NP0, SMD 0402; Manufacturer: Walsin Tech Corp; Manufacturer Part Number: RF15N0R7A500CT; Package Size: 0402; JLCPCB Basic Part: No; JLCPCB Part Number: C2909408; Supplier 1: LCSC; Category: Capacitors - MLCC; Supplier Part Number 1: C2909408; Voltage Rating: 50V; Temperature Coefficient: NP0; RoHS: Yes; ComponentLink1Description: Datasheet; ComponentLink1URL: https://wmsc.lcsc.com/wmsc/upload/file/pdf/v2/lcsc/2110281730_Walsin-Tech-Corp-RF15N0R7A500CT_C2909408.pdf; ComponentLink2Description: JLCPCB Part URL; ComponentLink2URL: https://jlcpcb.com/partdetail/C2909408; ComponentLink3Description: LCSC Part URL; ComponentLink3URL: https://lcsc.com/product-detail/Multilayer-Ceramic-Capacitors-MLCC---SMD-SMT_Walsin-Tech-Corp-Walsin-Tech-Corp-RF15N0R7A500CT_C2909408.html
footprint CAP-0402 (0402 (1005M) Capacitor)
pins: 1, 2

## RF15N0R7B500CT
designator C?  Capacitance: 0.7pF  (hidden comment: *)
Capacitor, Ceramic (MLCC), 0.7pF, 50V, NP0, SMD 0402; Manufacturer: Walsin Tech Corp; Manufacturer Part Number: RF15N0R7B500CT; Package Size: 0402; JLCPCB Basic Part: No; JLCPCB Part Number: C172846; Supplier 1: LCSC; Category: Capacitors - MLCC; Supplier Part Number 1: C172846; Voltage Rating: 50V; Temperature Coefficient: NP0; RoHS: Yes; ComponentLink1Description: Datasheet; ComponentLink1URL: https://wmsc.lcsc.com/wmsc/upload/file/pdf/v2/lcsc/2304140030_Walsin-Tech-Corp-RF15N0R7B500CT_C172846.pdf; ComponentLink2Description: JLCPCB Part URL; ComponentLink2URL: https://jlcpcb.com/partdetail/C172846; ComponentLink3Description: LCSC Part URL; ComponentLink3URL: https://lcsc.com/product-detail/Multilayer-Ceramic-Capacitors-MLCC---SMD-SMT_Walsin-Tech-Corp-Walsin-Tech-Corp-RF15N0R7B500CT_C172846.html
footprint CAP-0402 (0402 (1005M) Capacitor)
pins: 1, 2

## RF15N0R8A500
designator C?  Capacitance: 0.8pF  (hidden comment: *)
Capacitor, Ceramic (MLCC), 0.8pF, 50V, NP0, SMD 0402; Manufacturer: Walsin Tech Corp; Manufacturer Part Number: RF15N0R8A500; Package Size: 0402; JLCPCB Basic Part: No; JLCPCB Part Number: C172853; Supplier 1: LCSC; Category: Capacitors - MLCC; Supplier Part Number 1: C172853; Voltage Rating: 50V; Temperature Coefficient: NP0; RoHS: Yes; ComponentLink1Description: Datasheet; ComponentLink1URL: https://wmsc.lcsc.com/wmsc/upload/file/pdf/v2/lcsc/2304140030_Walsin-Tech-Corp-RF15N0R8A500_C172853.pdf; ComponentLink2Description: JLCPCB Part URL; ComponentLink2URL: https://jlcpcb.com/partdetail/C172853; ComponentLink3Description: LCSC Part URL; ComponentLink3URL: https://lcsc.com/product-detail/Multilayer-Ceramic-Capacitors-MLCC---SMD-SMT_Walsin-Tech-Corp-Walsin-Tech-Corp-RF15N0R8A500_C172853.html
footprint CAP-0402 (0402 (1005M) Capacitor)
pins: 1, 2

## RF15N0R8B500
designator C?  Capacitance: 0.8pF  (hidden comment: *)
Capacitor, Ceramic (MLCC), 0.8pF, 50V, NP0, SMD 0402; Manufacturer: Walsin Tech Corp; Manufacturer Part Number: RF15N0R8B500; Package Size: 0402; JLCPCB Basic Part: No; JLCPCB Part Number: C172820; Supplier 1: LCSC; Category: Capacitors - MLCC; Supplier Part Number 1: C172820; Voltage Rating: 50V; Temperature Coefficient: NP0; RoHS: Yes; ComponentLink1Description: Datasheet; ComponentLink1URL: https://wmsc.lcsc.com/wmsc/upload/file/pdf/v2/lcsc/2304140030_Walsin-Tech-Corp-RF15N0R8B500_C172820.pdf; ComponentLink2Description: JLCPCB Part URL; ComponentLink2URL: https://jlcpcb.com/partdetail/C172820; ComponentLink3Description: LCSC Part URL; ComponentLink3URL: https://lcsc.com/product-detail/Multilayer-Ceramic-Capacitors-MLCC---SMD-SMT_Walsin-Tech-Corp-Walsin-Tech-Corp-RF15N0R8B500_C172820.html
footprint CAP-0402 (0402 (1005M) Capacitor)
pins: 1, 2

## RF15N0R8B500CT
designator C?  Capacitance: 0.8pF  (hidden comment: *)
Capacitor, Ceramic (MLCC), 0.8pF, 50V, NP0, SMD 0402; Manufacturer: Walsin Tech Corp; Manufacturer Part Number: RF15N0R8B500CT; Package Size: 0402; JLCPCB Basic Part: No; JLCPCB Part Number: C396870; Supplier 1: LCSC; Category: Capacitors - MLCC; Supplier Part Number 1: C396870; Voltage Rating: 50V; Temperature Coefficient: NP0; RoHS: Yes; ComponentLink1Description: Datasheet; ComponentLink1URL: https://wmsc.lcsc.com/wmsc/upload/file/pdf/v2/lcsc/2304140030_Walsin-Tech-Corp-RF15N0R8B500CT_C396870.pdf; ComponentLink2Description: JLCPCB Part URL; ComponentLink2URL: https://jlcpcb.com/partdetail/C396870; ComponentLink3Description: LCSC Part URL; ComponentLink3URL: https://lcsc.com/product-detail/Multilayer-Ceramic-Capacitors-MLCC---SMD-SMT_Walsin-Tech-Corp-Walsin-Tech-Corp-RF15N0R8B500CT_C396870.html
footprint CAP-0402 (0402 (1005M) Capacitor)
pins: 1, 2

## RF15N0R9B500CT
designator C?  Capacitance: 0.9pF  (hidden comment: *)
Capacitor, Ceramic (MLCC), 0.9pF, 50V, NP0, SMD 0402; Manufacturer: Walsin Tech Corp; Manufacturer Part Number: RF15N0R9B500CT; Package Size: 0402; JLCPCB Basic Part: No; JLCPCB Part Number: C172861; Supplier 1: LCSC; Category: Capacitors - MLCC; Supplier Part Number 1: C172861; Voltage Rating: 50V; Temperature Coefficient: NP0; RoHS: Yes; ComponentLink1Description: Datasheet; ComponentLink1URL: https://wmsc.lcsc.com/wmsc/upload/file/pdf/v2/lcsc/2304140030_Walsin-Tech-Corp-RF15N0R9B500CT_C172861.pdf; ComponentLink2Description: JLCPCB Part URL; ComponentLink2URL: https://jlcpcb.com/partdetail/C172861; ComponentLink3Description: LCSC Part URL; ComponentLink3URL: https://lcsc.com/product-detail/Multilayer-Ceramic-Capacitors-MLCC---SMD-SMT_Walsin-Tech-Corp-Walsin-Tech-Corp-RF15N0R9B500CT_C172861.html
footprint CAP-0402 (0402 (1005M) Capacitor)
pins: 1, 2

## RF15N1R0A500CT
designator C?  Capacitance: 1pF  (hidden comment: *)
Capacitor, Ceramic (MLCC), 1pF, 50V, NP0, SMD 0402; Manufacturer: Walsin Tech Corp; Manufacturer Part Number: RF15N1R0A500CT; Package Size: 0402; JLCPCB Basic Part: No; JLCPCB Part Number: C172848; Supplier 1: LCSC; Category: Capacitors - MLCC; Supplier Part Number 1: C172848; Voltage Rating: 50V; Temperature Coefficient: NP0; RoHS: Yes; ComponentLink1Description: Datasheet; ComponentLink1URL: https://wmsc.lcsc.com/wmsc/upload/file/pdf/v2/lcsc/2304140030_Walsin-Tech-Corp-RF15N1R0A500CT_C172848.pdf; ComponentLink2Description: JLCPCB Part URL; ComponentLink2URL: https://jlcpcb.com/partdetail/C172848; ComponentLink3Description: LCSC Part URL; ComponentLink3URL: https://lcsc.com/product-detail/Multilayer-Ceramic-Capacitors-MLCC---SMD-SMT_Walsin-Tech-Corp-Walsin-Tech-Corp-RF15N1R0A500CT_C172848.html
footprint CAP-0402 (0402 (1005M) Capacitor)
pins: 1, 2

## RF15N1R0B500CT
designator C?  Capacitance: 1pF  (hidden comment: *)
Capacitor, Ceramic (MLCC), 1pF, 50V, NP0, SMD 0402; Manufacturer: Walsin Tech Corp; Manufacturer Part Number: RF15N1R0B500CT; Package Size: 0402; JLCPCB Basic Part: No; JLCPCB Part Number: C304677; Supplier 1: LCSC; Category: Capacitors - MLCC; Supplier Part Number 1: C304677; Voltage Rating: 50V; Temperature Coefficient: NP0; RoHS: Yes; ComponentLink1Description: Datasheet; ComponentLink1URL: https://wmsc.lcsc.com/wmsc/upload/file/pdf/v2/lcsc/2304140030_Walsin-Tech-Corp-RF15N1R0B500CT_C304677.pdf; ComponentLink2Description: JLCPCB Part URL; ComponentLink2URL: https://jlcpcb.com/partdetail/C304677; ComponentLink3Description: LCSC Part URL; ComponentLink3URL: https://lcsc.com/product-detail/Multilayer-Ceramic-Capacitors-MLCC---SMD-SMT_Walsin-Tech-Corp-Walsin-Tech-Corp-RF15N1R0B500CT_C304677.html
footprint CAP-0402 (0402 (1005M) Capacitor)
pins: 1, 2

## RF15N1R1B500CT
designator C?  Capacitance: 1.1pF  (hidden comment: *)
Capacitor, Ceramic (MLCC), 1.1pF, 50V, NP0, SMD 0402; Manufacturer: Walsin Tech Corp; Manufacturer Part Number: RF15N1R1B500CT; Package Size: 0402; JLCPCB Basic Part: No; JLCPCB Part Number: C180259; Supplier 1: LCSC; Category: Capacitors - MLCC; Supplier Part Number 1: C180259; Voltage Rating: 50V; Temperature Coefficient: NP0; RoHS: Yes; ComponentLink1Description: Datasheet; ComponentLink1URL: https://wmsc.lcsc.com/wmsc/upload/file/pdf/v2/lcsc/2304140030_Walsin-Tech-Corp-RF15N1R1B500CT_C180259.pdf; ComponentLink2Description: JLCPCB Part URL; ComponentLink2URL: https://jlcpcb.com/partdetail/C180259; ComponentLink3Description: LCSC Part URL; ComponentLink3URL: https://lcsc.com/product-detail/Multilayer-Ceramic-Capacitors-MLCC---SMD-SMT_Walsin-Tech-Corp-Walsin-Tech-Corp-RF15N1R1B500CT_C180259.html
footprint CAP-0402 (0402 (1005M) Capacitor)
pins: 1, 2

## RF15N1R2A500CT
designator C?  Capacitance: 1.2pF  (hidden comment: *)
Capacitor, Ceramic (MLCC), 1.2pF, 50V, NP0, SMD 0402; Manufacturer: Walsin Tech Corp; Manufacturer Part Number: RF15N1R2A500CT; Package Size: 0402; JLCPCB Basic Part: No; JLCPCB Part Number: C172868; Supplier 1: LCSC; Category: Capacitors - MLCC; Supplier Part Number 1: C172868; Voltage Rating: 50V; Temperature Coefficient: NP0; RoHS: Yes; ComponentLink1Description: Datasheet; ComponentLink1URL: https://wmsc.lcsc.com/wmsc/upload/file/pdf/v2/lcsc/2304140030_Walsin-Tech-Corp-RF15N1R2A500CT_C172868.pdf; ComponentLink2Description: JLCPCB Part URL; ComponentLink2URL: https://jlcpcb.com/partdetail/C172868; ComponentLink3Description: LCSC Part URL; ComponentLink3URL: https://lcsc.com/product-detail/Multilayer-Ceramic-Capacitors-MLCC---SMD-SMT_Walsin-Tech-Corp-Walsin-Tech-Corp-RF15N1R2A500CT_C172868.html
footprint CAP-0402 (0402 (1005M) Capacitor)
pins: 1, 2

## RF15N1R2B500CT
designator C?  Capacitance: 1.2pF  (hidden comment: *)
Capacitor, Ceramic (MLCC), 1.2pF, 50V, NP0, SMD 0402; Manufacturer: Walsin Tech Corp; Manufacturer Part Number: RF15N1R2B500CT; Package Size: 0402; JLCPCB Basic Part: No; JLCPCB Part Number: C340647; Supplier 1: LCSC; Category: Capacitors - MLCC; Supplier Part Number 1: C340647; Voltage Rating: 50V; Temperature Coefficient: NP0; RoHS: Yes; ComponentLink1Description: Datasheet; ComponentLink1URL: https://wmsc.lcsc.com/wmsc/upload/file/pdf/v2/lcsc/2304140030_Walsin-Tech-Corp-RF15N1R2B500CT_C340647.pdf; ComponentLink2Description: JLCPCB Part URL; ComponentLink2URL: https://jlcpcb.com/partdetail/C340647; ComponentLink3Description: LCSC Part URL; ComponentLink3URL: https://lcsc.com/product-detail/Multilayer-Ceramic-Capacitors-MLCC---SMD-SMT_Walsin-Tech-Corp-Walsin-Tech-Corp-RF15N1R2B500CT_C340647.html
footprint CAP-0402 (0402 (1005M) Capacitor)
pins: 1, 2

## RF15N1R2B500LT
designator C?  Capacitance: 1.2pF  (hidden comment: *)
Capacitor, Ceramic (MLCC), 1.2pF, 50V, NP0, SMD 0402; Manufacturer: Walsin Tech Corp; Manufacturer Part Number: RF15N1R2B500LT; Package Size: 0402; JLCPCB Basic Part: No; JLCPCB Part Number: C396874; Supplier 1: LCSC; Category: Capacitors - MLCC; Supplier Part Number 1: C396874; Voltage Rating: 50V; Temperature Coefficient: NP0; RoHS: Yes; ComponentLink1Description: Datasheet; ComponentLink1URL: https://wmsc.lcsc.com/wmsc/upload/file/pdf/v2/lcsc/2304140030_Walsin-Tech-Corp-RF15N1R2B500LT_C396874.pdf; ComponentLink2Description: JLCPCB Part URL; ComponentLink2URL: https://jlcpcb.com/partdetail/C396874; ComponentLink3Description: LCSC Part URL; ComponentLink3URL: https://lcsc.com/product-detail/Multilayer-Ceramic-Capacitors-MLCC---SMD-SMT_Walsin-Tech-Corp-Walsin-Tech-Corp-RF15N1R2B500LT_C396874.html
footprint CAP-0402 (0402 (1005M) Capacitor)
pins: 1, 2

## RF15N1R3B500CT
designator C?  Capacitance: 1.3pF  (hidden comment: *)
Capacitor, Ceramic (MLCC), 1.3pF, 50V, NP0, SMD 0402; Manufacturer: Walsin Tech Corp; Manufacturer Part Number: RF15N1R3B500CT; Package Size: 0402; JLCPCB Basic Part: No; JLCPCB Part Number: C180258; Supplier 1: LCSC; Category: Capacitors - MLCC; Supplier Part Number 1: C180258; Voltage Rating: 50V; Temperature Coefficient: NP0; RoHS: Yes; ComponentLink1Description: Datasheet; ComponentLink1URL: https://wmsc.lcsc.com/wmsc/upload/file/pdf/v2/lcsc/2304140030_Walsin-Tech-Corp-RF15N1R3B500CT_C180258.pdf; ComponentLink2Description: JLCPCB Part URL; ComponentLink2URL: https://jlcpcb.com/partdetail/C180258; ComponentLink3Description: LCSC Part URL; ComponentLink3URL: https://lcsc.com/product-detail/Multilayer-Ceramic-Capacitors-MLCC---SMD-SMT_Walsin-Tech-Corp-Walsin-Tech-Corp-RF15N1R3B500CT_C180258.html
footprint CAP-0402 (0402 (1005M) Capacitor)
pins: 1, 2
